# Altium footprint library SparkFun-Retired.PCBLIB: 302 footprints (part 12 of 19)
Each footprint in its own frame and in the unit in brackets; x right, y up, seen from the top. Pads: shape width x height; smd on the part's side, far side on the other; paste and mask are expansions set on the pad; w line width, h text height; cw(c..) or ccw(c..) is an arc to the next point about the centre after c.
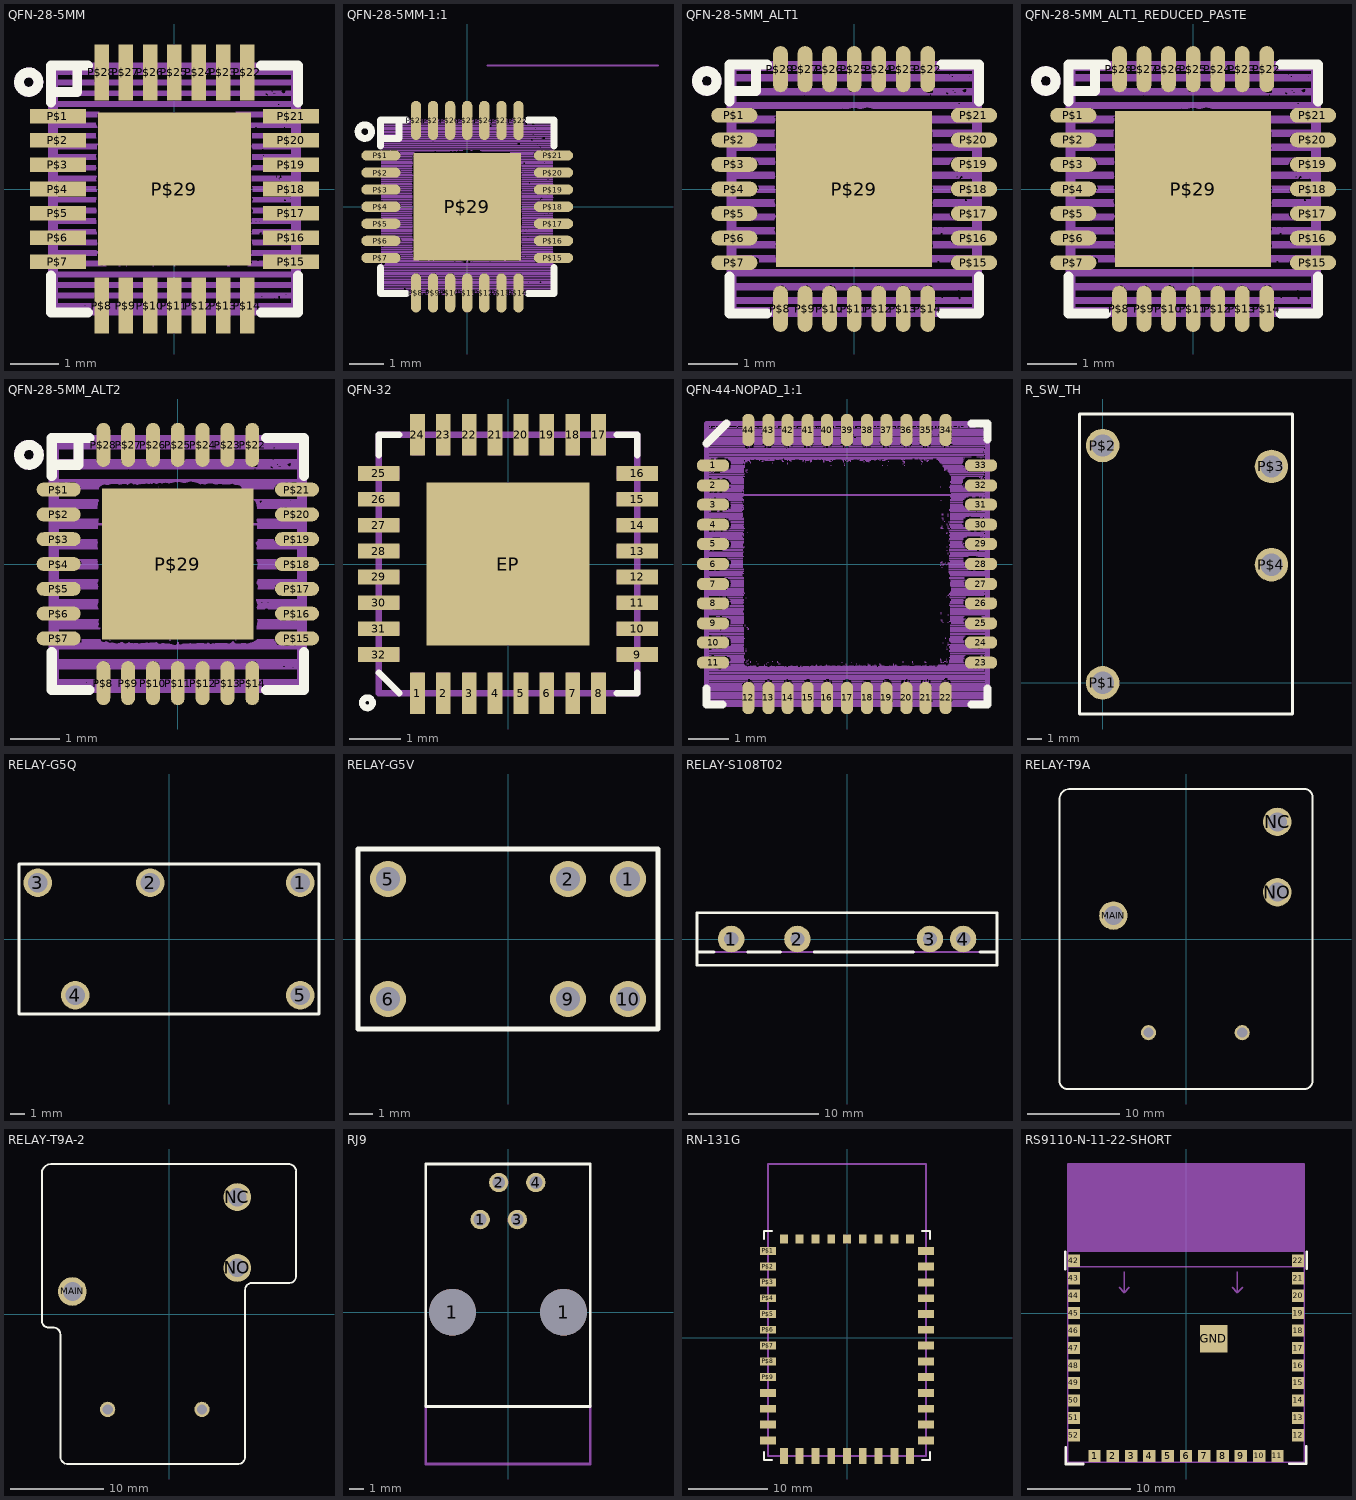
[diagram p11: the footprints below, top view; thin cyan lines are the x and y axes]

## QFN-28-5MM [mm]
pads (29):
  rect 1.15x0.3 smd: P$1(-2.4,1.5) P$2(-2.4,1) P$3(-2.4,0.5) P$4(-2.4,0) P$5(-2.4,-0.5) P$6(-2.4,-1) P$7(-2.4,-1.5) P$15(2.4,-1.5) P$16(2.4,-1) P$17(2.4,-0.5) P$18(2.4,0) P$19(2.4,0.5) P$20(2.4,1) P$21(2.4,1.5)
  rect 0.3x1.15 smd: P$8(-1.5,-2.4) P$9(-1,-2.4) P$10(-0.5,-2.4) P$11(0,-2.4) P$12(0.5,-2.4) P$13(1,-2.4) P$14(1.5,-2.4) P$22(1.5,2.4) P$23(1,2.4) P$24(0.5,2.4) P$25(0,2.4) P$26(-0.5,2.4) P$27(-1,2.4) P$28(-1.5,2.4)
  rect 3.15x3.15 smd: P$29(0,0)
Top Overlay:
  circle w0.203: c-3,2.2 r0.2
  lines w0.203: -2.54,-1.778 -2.54,-2.54 -1.778,-2.54 ; -2.54,1.778 -2.54,2.54 -1.778,2.54 ; -2.5,2 -2,2 -2,2.5 ; 1.778,-2.54 2.54,-2.54 2.54,-1.778 ; 1.778,2.54 2.54,2.54 ; 2.54,1.778 2.54,2.5
Top Paste:
  rectangle: -1.016,0.254 -0.254,1.016
  rectangle: 0.254,0.254 1.016,1.016
  rectangle: -1.016,-1.016 -0.254,-0.254
  rectangle: 0.254,-1.016 1.016,-0.254
Mechanical 16:
  circle w0.203: c-3,2.2 r0.2
  lines w0.203: -2.5,2 -2.5,2.5 -2,2.5 ; -2.5,2 -2.5,-2.5 2.5,-2.5 2.5,2.5 -2,2.5 ; -2.5,2 -2,2 -2,2.5
Mech84:
  drawing of 2255 lines, arcs and shapes, not listed

## QFN-28-5MM-1:1 [mm]
pads (29):
  rrect100% 1.15x0.3 smd: P$1(-2.527,1.5) P$2(-2.527,1) P$3(-2.527,0.5) P$4(-2.527,0) P$5(-2.527,-0.5) P$6(-2.527,-1) P$7(-2.527,-1.5) P$15(2.527,-1.5) P$16(2.527,-1) P$17(2.527,-0.5) P$18(2.527,0) P$19(2.527,0.5) P$20(2.527,1) P$21(2.527,1.5)
  rrect100% 0.3x1.15 smd: P$8(-1.5,-2.527) P$9(-1,-2.527) P$10(-0.5,-2.527) P$11(0,-2.527) P$12(0.5,-2.527) P$13(1,-2.527) P$14(1.5,-2.527) P$22(1.5,2.527) P$23(1,2.527) P$24(0.5,2.527) P$25(0,2.527) P$26(-0.5,2.527) P$27(-1,2.527) P$28(-1.5,2.527)
  rect 3.15x3.15 smd: P$29(0,0)
Top Overlay:
  circle w0.203: c-3,2.2 r0.2
  lines w0.203: -2.54,-1.778 -2.54,-2.54 -1.778,-2.54 ; -2.54,1.778 -2.54,2.54 -1.778,2.54 ; -2.5,2 -2,2 -2,2.5 ; 1.778,-2.54 2.54,-2.54 2.54,-1.778 ; 1.778,2.54 2.54,2.54 ; 2.54,1.778 2.54,2.5
Top Paste:
  rectangle: -1.016,0.254 -0.254,1.016
  rectangle: 0.254,0.254 1.016,1.016
  rectangle: -1.016,-1.016 -0.254,-0.254
  rectangle: 0.254,-1.016 1.016,-0.254
Mechanical 14:
  lines w0.051: 0.584,4.139 5.588,4.139
Mech84:
  drawing of 3628 lines, arcs and shapes, not listed

## QFN-28-5MM_ALT1 [mil]
pads (29):
  rrect100% 37x11.81 smd: P$1(-96.06,59.06) P$2(-96.06,39.37) P$3(-96.06,19.69) P$4(-96.06,0) P$5(-96.06,-19.69) P$6(-96.06,-39.37) P$7(-96.06,-59.06) P$15(96.06,-59.06) P$16(96.06,-39.37) P$17(96.06,-19.69) P$18(96.06,0) P$19(96.06,19.69) P$20(96.06,39.37) P$21(96.06,59.06)
  rrect100% 11.81x37 smd: P$8(-59.06,-96.06) P$9(-39.37,-96.06) P$10(-19.69,-96.06) P$11(0,-96.06) P$12(19.69,-96.06) P$13(39.37,-96.06) P$14(59.06,-96.06) P$22(59.06,96.06) P$23(39.37,96.06) P$24(19.69,96.06) P$25(0,96.06) P$26(-19.69,96.06) P$27(-39.37,96.06) P$28(-59.06,96.06)
  rect 125x125 smd: P$29(0,0)
Top Overlay:
  circle w8: c-118.11,86.61 r7.87
  lines w8: -100,-70 -100,-100 -70,-100 ; -100,70 -100,100 -70,100 ; -98.43,78.74 -78.74,78.74 -78.74,98.43 ; 70,-100 100,-100 100,-70 ; 70,100 100,100 ; 100,70 100,98.43
Top Paste:
  region: 13.5,-13.5 13.5,13.5 -13.5,13.5 -13.5,-13.5
Mechanical 14:
  lines w1.97: -101.22,31.58 95.63,31.58
Mechanical 16:
  circle w8: c-118.11,86.61 r7.87
  lines w8: -98.43,78.74 -98.43,98.43 -78.74,98.43 ; -98.43,78.74 -98.43,-98.43 98.43,-98.43 98.43,98.43 -78.74,98.43 ; -98.43,78.74 -78.74,78.74 -78.74,98.43
Mech84:
  drawing of 2254 lines, arcs and shapes, not listed

## QFN-28-5MM_ALT1_REDUCED_PASTE [mil]
pads (29):
  rrect100% 37x11.81 smd: P$1(-96.06,59.06) P$2(-96.06,39.37) P$3(-96.06,19.69) P$4(-96.06,0) P$5(-96.06,-19.69) P$6(-96.06,-39.37) P$7(-96.06,-59.06) P$15(96.06,-59.06) P$16(96.06,-39.37) P$17(96.06,-19.69) P$18(96.06,0) P$19(96.06,19.69) P$20(96.06,39.37) P$21(96.06,59.06)
  rrect100% 11.81x37 smd: P$8(-59.06,-96.06) P$9(-39.37,-96.06) P$10(-19.69,-96.06) P$11(0,-96.06) P$12(19.69,-96.06) P$13(39.37,-96.06) P$14(59.06,-96.06) P$22(59.06,96.06) P$23(39.37,96.06) P$24(19.69,96.06) P$25(0,96.06) P$26(-19.69,96.06) P$27(-39.37,96.06) P$28(-59.06,96.06)
  rect 125x125 smd: P$29(0,0)
Top Overlay:
  circle w8: c-118.11,86.61 r7.87
  lines w8: -100,-70 -100,-100 -70,-100 ; -100,70 -100,100 -70,100 ; -98.43,78.74 -78.74,78.74 -78.74,98.43 ; 70,-100 100,-100 100,-70 ; 70,100 100,100 ; 100,70 100,98.43
Top Paste:
  rectangle: -32.7,-33.4 -11.4,-12.5
  rectangle: 11.6,-33.3 32.9,-12.4
  rectangle: -33.1,13.1 -11.8,34
  rectangle: 12.8,14 34.1,34.9
  lines w10: -105.9,19.8 -83.7,19.8 ; -105.8,-59 -83.6,-59 ; -105.8,-19.5 -83.6,-19.5 ; -105.8,0.1 -83.6,0.1 ; -105.7,39.5 -83.5,39.5 ; -105.6,-39.2 -83.4,-39.2 ; -105.6,59.3 -83.4,59.3 ; -59.2,-105.2 -59.2,-83 ; -59.2,83.4 -59.2,105.6 ; -39.4,-105.4 -39.4,-83.2 ; -39.4,83.2 -39.4,105.4 ; -19.7,-105.2 -19.7,-83 ; -19.7,83.4 -19.7,105.6 ; -0.1,-105.2 -0.1,-83 ; -0.1,83.4 -0.1,105.6 ; 19.6,-105.1 19.6,-82.9 ; 19.6,83.5 19.6,105.7 ; 39.3,-105.3 39.3,-83.1 ; 39.3,83.3 39.3,105.5 ; 59.1,-105.4 59.1,-83.2 ; 59.1,83.2 59.1,105.4 ; 83,19.7 105.2,19.7 ; 83.1,-59.1 105.3,-59.1 ; 83.1,-19.6 105.3,-19.6 ; 83.1,0 105.3,0 ; 83.2,39.4 105.4,39.4 ; 83.3,-39.3 105.5,-39.3 ; 83.3,59.2 105.5,59.2
Mechanical 14:
  lines w1.97: -101.22,31.58 95.63,31.58
Mechanical 16:
  circle w8: c-118.11,86.61 r7.87
  lines w8: -98.43,78.74 -98.43,98.43 -78.74,98.43 ; -98.43,78.74 -98.43,-98.43 98.43,-98.43 98.43,98.43 -78.74,98.43 ; -98.43,78.74 -78.74,78.74 -78.74,98.43
Mech84:
  drawing of 2254 lines, arcs and shapes, not listed

## QFN-28-5MM_ALT2 [mil]
pads (29):
  rrect100% 35x11.02 smd: P$1(-94.52,59.06) P$2(-94.52,39.37) P$3(-94.52,19.69) P$4(-94.52,0) P$5(-94.52,-19.69) P$6(-94.52,-39.37) P$7(-94.52,-59.06) P$15(94.52,-59.06) P$16(94.52,-39.37) P$17(94.52,-19.69) P$18(94.52,0) P$19(94.52,19.69) P$20(94.52,39.37) P$21(94.52,59.06)
  rrect100% 11.02x35 smd: P$8(-59.06,-94.52) P$9(-39.37,-94.52) P$10(-19.69,-94.52) P$11(0,-94.52) P$12(19.69,-94.52) P$13(39.37,-94.52) P$14(59.06,-94.52) P$22(59.06,94.52) P$23(39.37,94.52) P$24(19.69,94.52) P$25(0,94.52) P$26(-19.69,94.52) P$27(-39.37,94.52) P$28(-59.06,94.52)
  rect 120x120 smd: P$29(0,0)
Top Overlay:
  circle w8: c-118.11,86.61 r7.87
  lines w8: -100,-70 -100,-100 -70,-100 ; -100,70 -100,100 -70,100 ; -98.43,78.74 -78.74,78.74 -78.74,98.43 ; 70,-100 100,-100 100,-70 ; 70,100 100,100 ; 100,70 100,98.43
Top Paste:
  rectangle: -55,5 -5,55
  rectangle: 5,5 55,55
  rectangle: -55,-55 -5,-5
  rectangle: 5,-55 55,-5
Mechanical 14:
  lines w1.97: -98.72,31.58 98.13,31.58
Mechanical 16:
  circle w8: c-118.11,86.61 r7.87
  lines w8: -98.43,78.74 -98.43,98.43 -78.74,98.43 ; -98.43,78.74 -98.43,-98.43 98.43,-98.43 98.43,98.43 -78.74,98.43 ; -98.43,78.74 -78.74,78.74 -78.74,98.43
Mech84:
  drawing of 2255 lines, arcs and shapes, not listed

## QFN-32 [mil]
pads (33):
  rect 11.2x31.5 smd: 1(-68.9,-98.43) 2(-49.21,-98.43) 3(-29.53,-98.43) 4(-9.84,-98.43) 5(9.84,-98.43) 6(29.53,-98.43) 7(49.21,-98.43) 8(68.9,-98.43) 17(68.9,98.43) 18(49.21,98.43) 19(29.53,98.43) 20(9.84,98.43) 21(-9.84,98.43) 22(-29.53,98.43) 23(-49.21,98.43) 24(-68.9,98.43)
  rect 31.5x11.2 smd: 9(98.43,-68.9) 10(98.43,-49.21) 11(98.43,-29.53) 12(98.43,-9.84) 13(98.43,9.84) 14(98.43,29.53) 15(98.43,49.21) 16(98.43,68.9) 25(-98.43,68.9) 26(-98.43,49.21) 27(-98.43,29.53) 28(-98.43,9.84) 29(-98.43,-9.84) 30(-98.43,-29.53) 31(-98.43,-49.21) 32(-98.43,-68.9)
  rect 124.02x124.02 smd: EP(0,0)
Top Overlay:
  circle w5: c-107,-105.66 r3.94
  lines w5: -98.43,-82.68 -82.68,-98.43 ; -98.43,82.68 -98.43,98.43 -82.68,98.43 ; 82.68,-98.43 98.43,-98.43 98.43,-82.68 ; 82.68,98.43 98.43,98.43 98.43,82.68
Top Paste:
  rectangle: -57.09,5.91 -5.91,57.09
  region: 5.91,57.09 5.91,5.91 57.09,5.91 57.09,57.09
  region: -5.91,-57.09 -5.91,-5.91 -57.09,-5.91 -57.09,-57.09
  region: 57.09,-5.91 5.91,-5.91 5.91,-57.09 57.09,-57.09
Mechanical 16:
  rectangle: -98.43,5.12 -82.68,14.57
  rectangle: -98.43,-14.57 -82.68,-5.12
  rectangle: -98.43,-34.25 -82.68,-24.8
  rectangle: -98.43,-53.94 -82.68,-44.49
  rectangle: -98.43,-73.62 -82.68,-64.17
  rectangle: -98.43,24.8 -82.68,34.25
  rectangle: -98.43,44.49 -82.68,53.94
  rectangle: -98.43,64.17 -82.68,73.62
  region: 5.12,98.43 5.12,82.68 14.57,82.68 14.57,98.43
  region: -14.57,98.43 -14.57,82.68 -5.12,82.68 -5.12,98.43
  region: -34.25,98.43 -34.25,82.68 -24.8,82.68 -24.8,98.43
  region: -53.94,98.43 -53.94,82.68 -44.49,82.68 -44.49,98.43
  region: -73.62,98.43 -73.62,82.68 -64.17,82.68 -64.17,98.43
  region: 24.8,98.43 24.8,82.68 34.25,82.68 34.25,98.43
  region: 44.49,98.43 44.49,82.68 53.94,82.68 53.94,98.43
  region: 64.17,98.43 64.17,82.68 73.62,82.68 73.62,98.43
  region: -5.12,-98.43 -5.12,-82.68 -14.57,-82.68 -14.57,-98.43
  region: 14.57,-98.43 14.57,-82.68 5.12,-82.68 5.12,-98.43
  region: 34.25,-98.43 34.25,-82.68 24.8,-82.68 24.8,-98.43
  region: 53.94,-98.43 53.94,-82.68 44.49,-82.68 44.49,-98.43
  region: 73.62,-98.43 73.62,-82.68 64.17,-82.68 64.17,-98.43
  region: -24.8,-98.43 -24.8,-82.68 -34.25,-82.68 -34.25,-98.43
  region: -44.49,-98.43 -44.49,-82.68 -53.94,-82.68 -53.94,-98.43
  region: -64.17,-98.43 -64.17,-82.68 -73.62,-82.68 -73.62,-98.43
  region: 98.43,-5.12 82.68,-5.12 82.68,-14.57 98.43,-14.57
  region: 98.43,14.57 82.68,14.57 82.68,5.12 98.43,5.12
  region: 98.43,34.25 82.68,34.25 82.68,24.8 98.43,24.8
  region: 98.43,53.94 82.68,53.94 82.68,44.49 98.43,44.49
  region: 98.43,73.62 82.68,73.62 82.68,64.17 98.43,64.17
  region: 98.43,-24.8 82.68,-24.8 82.68,-34.25 98.43,-34.25
  region: 98.43,-44.49 82.68,-44.49 82.68,-53.94 98.43,-53.94
  region: 98.43,-64.17 82.68,-64.17 82.68,-73.62 98.43,-73.62
  lines w5: -98.43,-98.43 98.43,-98.43 98.43,98.43 -98.43,98.43 -98.43,-98.43

## QFN-44-NOPAD_1:1 [mil]
pads (44):
  rrect85% 31.5x11.81 smd: 1(-131.36,96.76) 2(-131.36,77.08) 3(-131.36,58.22) 4(-131.36,38.54) 5(-131.36,19.69) 6(-131.36,0) 7(-131.36,-19.69) 8(-131.36,-38.54) 9(-131.36,-58.22) 10(-131.36,-77.08) 11(-131.36,-96.76) 23(131.36,-96.76) 24(131.36,-77.08) 25(131.36,-58.22) 26(131.36,-38.54) 27(131.36,-19.69) 28(131.36,0) 29(131.36,19.69) 30(131.36,38.54) 31(131.36,58.22) 32(131.36,77.08) 33(131.36,96.76)
  rrect85% 11.81x31.5 smd: 12(-96.76,-131.36) 13(-77.08,-131.36) 14(-58.22,-131.36) 15(-38.54,-131.36) 16(-19.69,-131.36) 17(0,-131.36) 18(19.69,-131.36) 19(38.54,-131.36) 20(58.22,-131.36) 21(77.08,-131.36) 22(96.76,-131.36) 34(96.76,131.36) 35(77.08,131.36) 36(58.22,131.36) 37(38.54,131.36) 38(19.69,131.36) 39(0,131.36) 40(-19.69,131.36) 41(-38.54,131.36) 42(-58.22,131.36) 43(-77.08,131.36) 44(-96.76,131.36)
Top Overlay:
  lines w8: -137.8,-122.05 -137.8,-137.8 -122.05,-137.8 ; -137.8,118.11 -118.11,137.8 ; 122.05,-137.8 137.8,-137.8 137.8,-122.05 ; 122.05,137.8 137.8,137.8 137.8,122.05
Mechanical 14:
  lines w2: -136.6,67.45 134.4,67.45
Mechanical 16:
  lines w5: -137.8,-137.8 -137.8,137.8 137.8,137.8 137.8,-137.8 -133.86,-137.8
Mech84:
  drawing of 2800 lines, arcs and shapes, not listed

## R_SW_TH [mil]
pads (4):
  round 94.5 hole 63: P$1(0,0) P$2(0,669) P$3(476,610) P$4(476,333)
Top Overlay:
  lines w8: -65,-88 -65,-54 -65,758 535,758 535,-88 -65,-88

## RELAY-G5Q [mil]
pads (5):
  round 76.77 hole 51.18: 1(350,150) 2(-50,150) 3(-350,150) 4(-250,-150) 5(350,-150)
Top Overlay:
  lines w8: -400,-200 400,-200 400,200 -400,200 -400,-200

## RELAY-G5V [mil]
pads (6):
  round 60 hole 40: 1(200,100) 2(100,100) 5(-200,100) 6(-200,-100) 9(100,-100) 10(200,-100)
Top Overlay:
  lines w8: -250,-150 250,-150 250,150 -250,150 -250,-150

## RELAY-S108T02 [mil]
pads (4):
  round 80 hole 43.31: 1(-349.61,0) 2(-149.61,0) 3(250.39,0) 4(350.39,0)
Top Overlay:
  lines w8: -401.57,-39.37 -452.76,-39.37 ; -299.21,-39.37 -200.79,-39.37 ; -98.43,-39.37 200.79,-39.37 ; 401.57,-39.37 452.76,-39.37 ; -452.76,-39.37 -452.76,-78.74 452.76,-78.74 452.76,-39.37 ; -452.76,-39.37 -452.76,78.74 452.76,78.74 452.76,-39.37
Mechanical 16:
  lines w5: -452.76,-39.37 452.76,-39.37

## RELAY-T9A [mil]
pads (5):
  round 64.5 hole 43: COIL1(-160,-400) COIL2(240,-400)
  round 121.5 hole 81: MAIN(-310,100) NC(390,500) NO(390,200)
Top Overlay:
  lines w8: -540,-600 -540,600 cw(c-497.5,597.5) -500,640 500,640 cw(c505,605) 540,600 540,-600 cw(c505,-605) 500,-640 -500,-640 cw(c-505,-605) -540,-600

## RELAY-T9A-2 [mm]
pads (5):
  round 1.65 hole 1.1: COIL1(-6.61,-10.27) COIL2(3.55,-10.27)
  round 3.086 hole 2.057: MAIN(-10.41,2.43)
  round 3 hole 2: NC(7.35,12.6) NO(7.35,4.97)
Top Overlay:
  lines w0.203: -13.7,-0.7 -13.7,15.24 cw(c-12.688,15.133) -12.7,16.15 12.7,16.15 cw(c12.859,15.32) 13.7,15.24 13.7,4.1 cw(c12.928,4.119) 13,3.35 8.9,3.35 ccw(c8.972,2.581) 8.2,2.6 8.2,-15.4 cw(c7.428,-15.381) 7.5,-16.15 -11,-16.15 cw(c-10.917,-15.358) -11.7,-15.5 -11.7,-2.2 ccw(c-12.472,-2.219) -12.4,-1.45 -13,-1.45 cw(c-12.984,-0.734) -13.7,-0.7

## RJ9 [mil]
pads (6):
  round 125.98 hole 125.98: 1(-150,0) 1(150,0)
  round 52.5 hole 35: 1(-75,250) 2(-25,350) 3(25,250) 4(75,350)
Top Overlay:
  lines w8: -222.05,-255 -222.05,400 222.05,400 222.05,-255 -222.05,-255
Mechanical 16:
  lines w8: -222.05,-255 -222.05,-409.84 222.05,-409.84 222.05,-255

## RN-131G [mm]
pads (44):
  rect 2x1 smd: P$1(-10,11) P$2(-10,9) P$3(-10,7) P$4(-10,5) P$5(-10,3) P$6(-10,1) P$7(-10,-1) P$8(-10,-3) P$9(-10,-5) P$10(-10,-7) P$11(-10,-9) P$12(-10,-11) P$13(-10,-13) P$23(10,-13) P$24(10,-11) P$25(10,-9) P$26(10,-7) P$27(10,-5) P$28(10,-3) P$29(10,-1) P$30(10,1) P$31(10,3) P$32(10,5) P$33(10,7) P$34(10,9) P$35(10,11)
  rect 1x2 smd: P$14(-8,-15) P$15(-6,-15) P$16(-4,-15) P$17(-2,-15) P$18(0,-15) P$19(2,-15) P$20(4,-15) P$21(6,-15) P$22(8,-15)
  rect 1x1.11 smd: P$36(8,12.492) P$37(6,12.492) P$38(4,12.492) P$39(2,12.492) P$40(0,12.492) P$41(-2,12.492) P$42(-4,12.492) P$43(-6,12.492) P$44(-8,12.492)
Top Overlay:
  lines w0.254: -10.5,-14.5 -10.5,-15.5 -9.5,-15.5 ; -10.5,12.5 -10.5,13.5 -9.5,13.5 ; 9.5,-15.5 10.5,-15.5 10.5,-14.5 ; 9.5,13.5 10.5,13.5 10.5,12.5
Mechanical 16:
  lines w0.254: -10,-15 10,-15 10,22 -10,22 -10,-15

## RS9110-N-11-22-SHORT [mil]
pads (34):
  rect 47.24x47.24 smd: 1(-350.39,-547.24) 2(-280.32,-547.24) 3(-210.24,-547.24) 4(-140.16,-547.24) 5(-70.08,-547.24) 6(0,-547.24) 7(70.08,-547.24) 8(140.16,-547.24) 9(210.24,-547.24) 10(280.32,-547.24) 11(350.39,-547.24) 12(429.13,-468.5) 13(429.13,-401.57) 14(429.13,-334.65) 15(429.13,-267.72) 16(429.13,-200.79) 17(429.13,-133.86) 18(429.13,-66.93) 19(429.13,0) 20(429.13,66.93) 21(429.13,133.86) 22(429.13,200.79) 42(-429.13,200.79) 43(-429.13,133.86) 44(-429.13,66.93) 45(-429.13,0) 46(-429.13,-66.93) 47(-429.13,-133.86) 48(-429.13,-200.79) 49(-429.13,-267.72) 50(-429.13,-334.65) 51(-429.13,-401.57) 52(-429.13,-468.5)
  rect 106.3x106.3 smd: GND(106.3,-98.43)
Top Overlay:
  lines w10: -463,168 -463,235 ; -460,-514 -460,-578 -393,-578 ; 396,-577 460,-577 460,-510 ; 463,170 463,234
Mechanical 16:
  lines w5: -255.91,98.43 -236.22,78.74 ; -236.22,157.48 -236.22,78.74 ; -216.54,98.43 -236.22,78.74 ; 177.17,98.43 196.85,78.74 ; 196.85,157.48 196.85,78.74 ; 216.54,98.43 196.85,78.74 ; 452.76,177.17 -452.76,177.17 ; -452.76,177.17 -452.76,236.22 ; -452.76,177.17 -452.76,-570.87 452.76,-570.87 452.76,236.22 ; -452.76,236.22 452.76,236.22 ; -452.76,236.22 -452.76,570.87 452.76,570.87 452.76,236.22
  text "no copper" at -157.48,472.44 h77.5
  text "GND plane" at -196.85,118.11 h77.5
Mechanical 27:
  rectangle: -452.76,236.22 452.76,570.87